# Altium footprint library Capacitors.PcbLib: 90 footprints (part 3 of 6)
Each footprint in its own frame and in the unit in brackets; x right, y up, seen from the top. Pads: shape width x height; smd on the part's side, far side on the other; paste and mask are expansions set on the pad; w line width, h text height; cw(c..) or ccw(c..) is an arc to the next point about the centre after c.
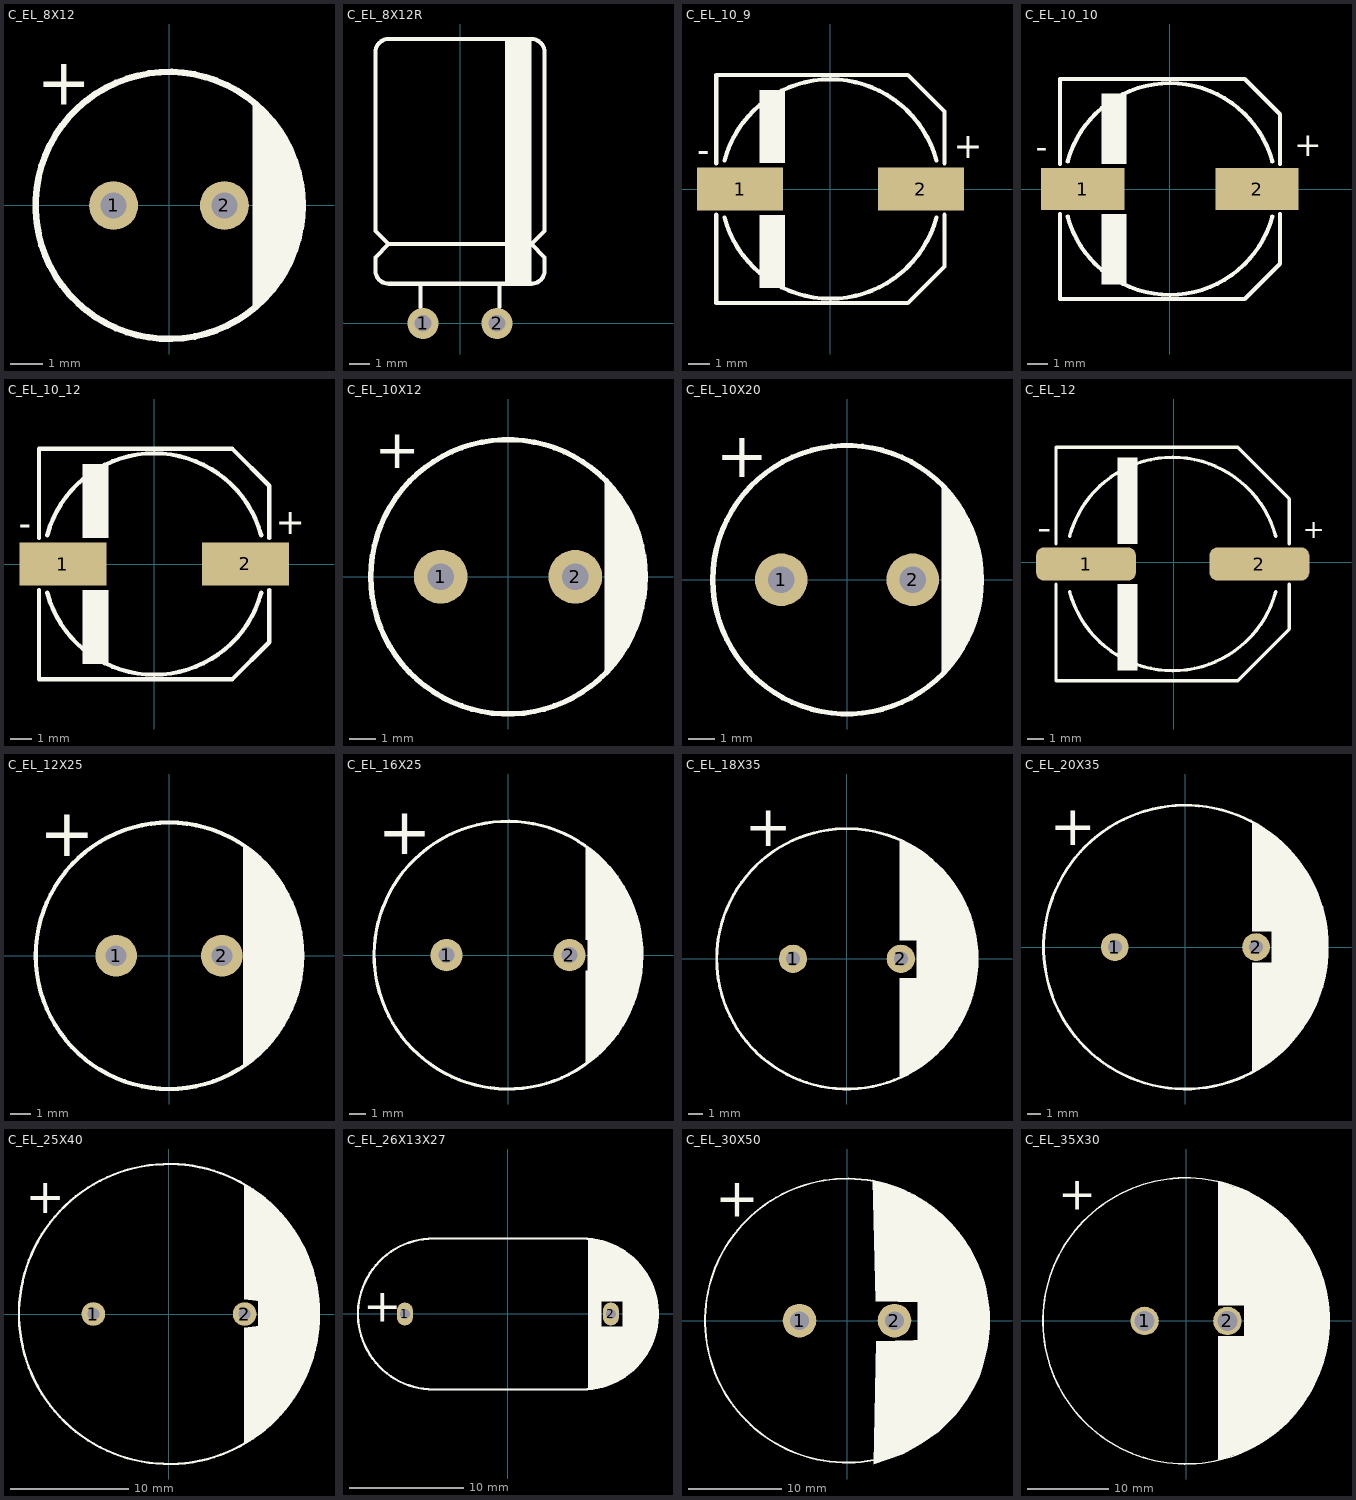
[diagram p2: the footprints below, top view; thin cyan lines are the x and y axes]

## C_EL_8X12 [mm] "Cap Elec, D8.0X12.0H pitch: 3.5mm, RB.14/.26, RB.15/.32"
height 12
pads (2):
  round 1.5 hole 0.8: 1(-1.7,0) 2(1.7,0)
Top Overlay:
  circle w0.2: c0,0 r4.1
  rectangle: 2.565,2.878 2.692,3.132
  rectangle: 2.565,-3.132 2.692,-2.878
  rectangle: 3.31,-2 3.691,1.962
  rectangle: 3.2,-2.286 3.505,2.291
  rectangle: 2.87,-2.534 3.302,2.575
  rectangle: 2.87,-2.718 3.124,2.769
  rectangle: 2.565,-2.972 2.946,2.975
  rectangle: 3.2,-1.575 3.886,1.575
  rectangle: 3.785,-1.067 4.013,0.991
  text "+" at -4.064,2.611 h2.5
3D body "User Library-Cap electro 8x11_5x3_5mm.step": height 2.98, standoff -12.53, extent -4.025,-4.025 4.025,4.025

## C_EL_8X12R [mm] "Cap Elec, D8.0X12.0H pitch: 3.5mm, RIGHT ANGLE"
pads (2):
  round 1.5 hole 0.8: 1(-1.778,0) 2(1.778,0)
Top Overlay:
  region: 2.159,13.67 2.159,1.905 3.429,1.905 3.429,13.67
  lines w0.2: -1.905,0.762 -1.905,1.905 ; 1.905,0.787 1.905,1.905 ; -3.429,3.81 -4.064,4.445 -4.064,13.035 cw(c-3.429,13.035) -3.429,13.67 3.429,13.67 cw(c3.429,13.035) 4.064,13.035 4.064,4.445 3.429,3.81 ; -3.429,3.81 -4.064,3.175 -4.064,2.54 ccw(c-3.429,2.54) -3.429,1.905 3.429,1.905 ccw(c3.429,2.54) 4.064,2.54 4.064,3.175 3.429,3.81 ; -3.429,3.81 3.429,3.81
3D body "User Library-Cap electro 8x11_5x3_5mm RA.step": height 8.03, standoff -2, extent -4.025,-0.3 4.025,13.521

## C_EL_10_9 [mm] "Electrolytic Cap, 10.3mm, L: 8.7mm"
height 8.7
pads (2):
  rect 4x2 smd: 1(-4.2,0) 2(4.2,0)
Top Overlay:
  region: -2.1,4.6 -3.3,4.6 -3.3,1.2 -2.1,1.2
  region: -2.1,-1.2 -3.3,-1.2 -3.3,-4.6 -2.1,-4.6
  lines w0.2: -5.3,-1.2 -5.3,-5.3 3.6,-5.3 5.3,-3.6 5.3,-1.2 ; -5.3,1.2 -5.3,5.3 3.6,5.3 5.3,3.6 5.3,1.2 ; -4.926,-1.32 ccw(c0,0) 4.926,-1.32 ; -4.926,1.32 cw(c0,0) 4.926,1.32
  text "+" at 5.74,1.038 h2
  text "-" at -6.198,0.86 h2
3D body "10x8.7x4.5.stp": height 8.55, standoff -0.15, extent -5.5,-5.15 5.5,5.15

## C_EL_10_10 [mm] "Electrolytic Cap, 10.3mm, L: 10mm"
height 10
pads (2):
  rect 4x2 smd: 1(-4.2,0) 2(4.2,0)
Top Overlay:
  region: -2.1,4.6 -3.3,4.6 -3.3,1.2 -2.1,1.2
  region: -2.1,-1.2 -3.3,-1.2 -3.3,-4.6 -2.1,-4.6
  lines w0.2: -5.3,-1.2 -5.3,-5.3 3.6,-5.3 5.3,-3.6 5.3,-1.2 ; -5.3,1.2 -5.3,5.3 3.6,5.3 5.3,3.6 5.3,1.2 ; -4.926,-1.32 ccw(c0,0) 4.926,-1.32 ; -4.926,1.32 cw(c0,0) 4.926,1.32
  text "-" at -6.452,1.089 h2
  text "+" at 5.994,1.19 h2
3D body "User Library-cap_10x10x10-1.STEP": height 10.5, standoff 0, extent -5.899,-5.25 5.901,5.25

## C_EL_10_12 [mm] "Electrolytic Cap, 10.3mm, L: 12.4mm"
height 12.4
pads (2):
  rect 4x2 smd: 1(-4.2,0) 2(4.2,0)
Top Overlay:
  region: -2.1,4.6 -3.3,4.6 -3.3,1.2 -2.1,1.2
  region: -2.1,-1.2 -3.3,-1.2 -3.3,-4.6 -2.1,-4.6
  lines w0.2: -5.3,-1.2 -5.3,-5.3 3.6,-5.3 5.3,-3.6 5.3,-1.2 ; -5.3,1.2 -5.3,5.3 3.6,5.3 5.3,3.6 5.3,1.2 ; -4.926,-1.32 ccw(c0,0) 4.926,-1.32 ; -4.926,1.32 cw(c0,0) 4.926,1.32
  text "+" at 5.588,0.987 h2
  text "-" at -6.223,0.937 h2
3D body "10x12.4x4.5.stp": height 12.45, standoff 0.05, extent -5.5,-5.15 5.5,5.15

## C_EL_10X12 [mm] "Cap Elec, D10.0X12.0H pitch: 5.0mm"
height 12
pads (2):
  round 2 hole 1: 1(-2.5,0) 2(2.5,0)
Top Overlay:
  circle w0.2: c0,0 r5.1
  rectangle: 3.581,-1.612 4.901,-0.952
  rectangle: 3.581,-1.194 5.055,1.016
  rectangle: 3.581,-3.531 3.785,-1.372
  rectangle: 3.581,-2.032 4.75,-1.473
  rectangle: 3.708,-2.438 4.572,-1.905
  rectangle: 3.709,-2.676 4.421,-1.94
  rectangle: 3.658,-3.302 4.013,-2.527
  rectangle: 3.878,-3.015 4.229,-2.462
  rectangle: 3.581,0.952 4.901,1.612
  rectangle: 3.581,-1.016 5.055,1.194
  rectangle: 3.581,1.372 3.785,3.531
  rectangle: 3.581,1.473 4.75,2.032
  rectangle: 3.708,1.905 4.572,2.438
  rectangle: 3.709,1.94 4.421,2.676
  rectangle: 3.658,2.527 4.013,3.302
  rectangle: 3.878,2.462 4.229,3.015
  text "+" at -4.953,3.551 h2.5
3D body "ELE Radial 10x12.STEP": height 13.7, standoff -1.7, extent -5.105,-5.099 5.05,5.061

## C_EL_10X20 [mm] "Cap Elec, D10.0X20.0H pitch: 5.0mm, RB.2/.4"
height 20
pads (2):
  round 2 hole 1: 1(-2.5,0) 2(2.5,0)
Top Overlay:
  circle w0.2: c0,0 r5.1
  rectangle: 3.6,-1 5.1,1
  rectangle: 3.581,0.952 4.901,1.612
  rectangle: 3.581,-1.016 5.055,1.194
  rectangle: 3.581,1.372 3.785,3.531
  rectangle: 3.581,1.473 4.75,2.032
  rectangle: 3.708,1.905 4.572,2.438
  rectangle: 3.709,1.94 4.421,2.676
  rectangle: 3.658,2.527 4.013,3.302
  rectangle: 3.878,2.462 4.229,3.015
  rectangle: 3.581,-1.612 4.901,-0.952
  rectangle: 3.581,-1.194 5.055,1.016
  rectangle: 3.581,-3.531 3.785,-1.372
  rectangle: 3.581,-2.032 4.75,-1.473
  rectangle: 3.708,-2.438 4.572,-1.905
  rectangle: 3.709,-2.676 4.421,-1.94
  rectangle: 3.658,-3.302 4.013,-2.527
  rectangle: 3.878,-3.015 4.229,-2.462
  text "+" at -4.978,3.296 h3
3D body "CE_R200_D400_H800.step": height 20.62, standoff -2.6, extent -5.08,-5.101 5.08,5.038

## C_EL_12 [mm] "Electrolytic Cap, 12.5x13mm"
height 10
pads (2):
  rrect50% 6x2 smd mask+0.1: 1(-5.251,-0.102) 2(5.149,-0.102)
Top Overlay:
  region: -2.151,6.298 -3.351,6.298 -3.351,1.098 -2.151,1.098
  region: -2.151,-1.302 -3.351,-1.302 -3.351,-6.502 -2.151,-6.502
  lines w0.2: -7.051,-1.302 -7.051,-7.102 3.849,-7.102 6.949,-4.002 6.949,-1.302 ; -7.051,1.098 -7.051,6.898 3.849,6.898 6.949,3.798 6.949,1.098 ; -6.233,-1.758 ccw(c-0.051,-0.102) 6.131,-1.758 ; -6.233,1.555 cw(c-0.051,-0.102) 6.131,1.555
  text "-" at -8.179,0.693 h3
  text "+" at 7.747,1.063 h2
3D body "User Library-ALU-H16.step": height 17, standoff 0, extent -7.801,-6.951 7.699,6.749

## C_EL_12X25 [mm] "Cap Elec, D12.0X25.0H pitch: 5.0mm, RB.2/.5"
pads (2):
  round 2 hole 1: 1(-2.54,0) 2(2.54,0)
Top Overlay:
  circle w0.2: c0,0 r6.4
  rectangle: 4.11,-4.619 4.408,-4.492
  rectangle: 4.668,-4.115 4.925,-3.88
  rectangle: 4.439,-4.393 4.801,-3.937
  rectangle: 4.14,-4.572 4.521,-3.81
  rectangle: 3.694,-5.083 4.052,-4.774
  rectangle: 3.645,-4.844 4.327,-4.246
  rectangle: 3.683,-4.623 4.318,-3.81
  rectangle: 3.619,-4.064 5.029,-3.785
  rectangle: 3.668,-2.438 5.994,-1.905
  rectangle: 3.669,-2.676 5.817,-1.94
  rectangle: 3.838,-3.015 5.732,-2.462
  rectangle: 3.618,-3.302 5.571,-2.527
  rectangle: 3.541,-5.232 3.785,-3.251
  rectangle: 3.678,-3.729 5.297,-3.465
  rectangle: 3.619,-3.868 5.233,-3.67
  rectangle: 3.619,3.67 5.233,3.868
  rectangle: 3.678,3.465 5.297,3.729
  rectangle: 3.541,3.251 3.785,5.232
  rectangle: 3.618,-3.302 5.571,-2.527
  rectangle: 3.838,-3.015 5.732,-2.462
  rectangle: 3.669,-2.676 5.817,-1.94
  rectangle: 3.668,-2.438 5.994,-1.905
  rectangle: 3.541,-2.032 6.121,-1.473
  rectangle: 3.541,-3.531 5.403,-1.372
  rectangle: 3.541,-1.194 5.015,1.016
  rectangle: 3.541,-1.612 6.274,-0.952
  rectangle: 3.541,-1.016 6.4,1.194
  rectangle: 3.618,2.527 5.571,3.302
  rectangle: 3.838,2.462 5.732,3.015
  rectangle: 3.669,1.94 5.817,2.676
  rectangle: 3.668,1.905 5.994,2.438
  rectangle: 3.541,1.473 6.121,2.032
  rectangle: 3.541,1.372 5.403,3.531
  rectangle: 3.541,-1.016 5.015,1.194
  rectangle: 3.541,0.952 6.274,1.612
  rectangle: 3.541,-1.194 6.4,1.016
  rectangle: 3.619,3.785 5.029,4.064
  rectangle: 3.683,3.81 4.318,4.623
  rectangle: 3.645,4.246 4.327,4.844
  rectangle: 3.694,4.774 4.052,5.083
  rectangle: 4.14,3.81 4.521,4.572
  rectangle: 4.439,3.937 4.801,4.393
  rectangle: 4.668,3.88 4.925,4.115
  rectangle: 4.11,4.492 4.408,4.619
  text "+" at -6.223,4.006 h4
3D body "User Library-Cap-EL(12_5x25-5)T.step": height 25.8, standoff -3.2, extent -6.25,-6.281 6.252,6.219

## C_EL_16X25 [mm] "Cap Elec, D16.0X25.0H pitch: 7.6mm, RB.3/.6"
pads (2):
  round 2 hole 1: 1(-3.81,0) 2(3.81,0)
Top Overlay:
  rectangle: 7.46,2.133 7.886,2.914
  rectangle: 7.391,1.397 8.077,2.311
  rectangle: 4.938,1.905 7.264,4.173
  rectangle: 5.07,-0.7 8.25,1.441
  rectangle: 5.38,-4.619 5.678,-4.492
  rectangle: 5.938,-4.115 6.195,-3.88
  rectangle: 5.709,-4.393 6.071,-3.937
  rectangle: 5.41,-4.572 5.791,-3.81
  rectangle: 4.964,-5.083 5.322,-4.774
  rectangle: 4.915,-4.844 5.597,-4.246
  rectangle: 4.953,-4.623 5.588,-3.81
  rectangle: 4.889,-4.064 6.299,-3.785
  rectangle: 4.938,-2.438 7.264,-1.905
  rectangle: 4.939,-2.676 7.087,-1.94
  rectangle: 5.108,-3.015 7.002,-2.462
  rectangle: 4.888,-3.302 6.841,-2.527
  rectangle: 4.811,-5.232 5.055,-3.251
  rectangle: 4.948,-3.729 6.567,-3.465
  rectangle: 4.889,-3.868 6.503,-3.67
  rectangle: 4.889,3.67 6.503,5.309
  rectangle: 4.948,3.465 6.567,5.029
  rectangle: 4.811,3.251 5.055,6.655
  rectangle: 4.888,-3.302 6.841,-2.527
  rectangle: 5.108,-3.015 7.002,-2.462
  rectangle: 4.939,-2.676 7.087,-1.94
  rectangle: 4.938,-2.438 7.264,-1.905
  rectangle: 4.811,-2.032 7.391,-1.473
  rectangle: 4.811,-3.531 6.673,-1.372
  rectangle: 4.979,-1.194 6.285,1.016
  rectangle: 4.811,-1.612 7.544,-0.952
  rectangle: 5.09,-1.016 7.67,3.305
  rectangle: 4.888,2.527 6.841,4.949
  rectangle: 5.108,2.462 7.002,4.597
  rectangle: 4.939,1.94 7.087,4.317
  rectangle: 4.811,1.473 7.391,3.835
  rectangle: 4.811,1.372 6.673,3.531
  rectangle: 4.953,-1.016 6.285,1.194
  rectangle: 4.811,0.952 7.544,3.617
  rectangle: 4.979,-1.194 7.67,1.016
  rectangle: 4.889,3.785 6.299,5.401
  rectangle: 4.953,3.81 5.588,4.623
  rectangle: 4.915,4.246 5.597,6.275
  rectangle: 4.964,4.774 5.322,6.502
  rectangle: 5.41,3.81 5.791,5.994
  rectangle: 5.709,3.937 6.071,5.819
  rectangle: 5.938,3.88 6.195,5.63
  rectangle: 5.38,4.492 5.678,5.994
  rectangle: 7.46,-2.914 7.886,-2.133
  rectangle: 7.391,-2.311 8.077,-1.397
  rectangle: 4.938,-4.173 7.264,-1.905
  rectangle: 5.07,-1.441 8.25,0.7
  rectangle: 4.889,-5.309 6.503,-3.67
  rectangle: 4.948,-5.029 6.567,-3.465
  rectangle: 4.811,-6.655 5.055,-3.251
  rectangle: 5.129,-3.305 7.67,1.016
  rectangle: 4.888,-4.949 6.841,-2.527
  rectangle: 5.108,-4.597 7.002,-2.462
  rectangle: 4.939,-4.317 7.087,-1.94
  rectangle: 4.811,-3.835 7.391,-1.473
  rectangle: 4.811,-3.531 6.673,-1.372
  rectangle: 4.918,-1.194 6.285,1.016
  rectangle: 4.811,-3.617 7.544,-0.952
  rectangle: 4.889,-5.401 6.299,-3.785
  rectangle: 4.953,-4.623 5.588,-3.81
  rectangle: 4.915,-6.275 5.597,-4.246
  rectangle: 4.964,-6.502 5.322,-4.774
  rectangle: 5.41,-5.994 5.791,-3.81
  rectangle: 5.709,-5.819 6.071,-3.937
  rectangle: 5.938,-5.63 6.195,-3.88
  rectangle: 5.38,-5.994 5.678,-4.492
  lines w0.2: 8.148,-1.584 cw(c0,0) 8.152,-1.563
  text "+" at -8.077,5.299 h5
3D body "User Library-CE_R300_D650_H1000.step": height 25.4, standoff -3.5, extent -8.402,-7.785 8.098,8.7

## C_EL_18X35 [mm] "Cap Elec, D18.0X35.0H pitch: 7.6mm, RB.3/.7"
pads (2):
  round 2 hole 1: 1(-3.81,0) 2(3.81,0)
Top Overlay:
  circle w0.2: c0,0 r9.2
  rectangle: 8.382,-1.626 9.119,-0.356
  rectangle: 8.026,-0.635 9.119,1.321
  rectangle: 8.484,0.152 9.017,1.88
  rectangle: 8.484,-2.134 8.915,2.261
  rectangle: 7.391,-3.683 8.484,-3.15
  rectangle: 7.493,-3.378 8.585,-2.819
  rectangle: 7.391,-3.937 8.331,-3.15
  rectangle: 7.671,-3.15 8.712,-2.565
  rectangle: 8.052,-2.743 8.814,-1.88
  rectangle: 7.849,-4.216 8.23,-2.184
  rectangle: 8.001,-2.337 8.839,2.896
  rectangle: 3.732,-8.309 4.163,-7.87
  rectangle: 3.752,-8.127 4.438,-7.949
  rectangle: 4.117,-7.906 4.902,-7.468
  rectangle: 3.734,-7.976 4.521,-7.442
  region: 3.711,-8.357 3.761,-8.356 3.756,-7.341 3.707,-7.341
  rectangle: 3.937,-7.493 5.486,-6.833
  rectangle: 3.708,-7.698 5.182,-1.348
  region: 6.966,-5.663 7.391,-5.588 7.347,-5.338 6.922,-5.413
  rectangle: 6.502,-6.126 6.985,6.147
  rectangle: 5.994,-6.413 6.731,6.401
  rectangle: 6.121,-6.604 6.477,6.655
  rectangle: 5.867,-6.856 6.274,6.858
  rectangle: 4.928,-7.112 5.994,7.112
  rectangle: 3.708,1.299 5.182,7.698
  rectangle: 3.707,7.479 4.342,8.179
  rectangle: 3.707,7.95 4.039,8.329
  rectangle: 4.088,7.53 4.953,7.826
  rectangle: 4.242,7.772 4.663,8.011
  rectangle: 4.47,1.448 5.41,7.53
  rectangle: 5.156,-7.315 5.69,7.366
  rectangle: 6.172,-4.547 8.077,4.191
  rectangle: 6.096,3.759 7.163,5.842
  rectangle: 6.731,3.048 7.341,5.639
  rectangle: 7.112,2.896 7.544,5.41
  rectangle: 7.391,3.327 7.696,5.182
  rectangle: 7.62,3.734 7.849,4.851
  rectangle: 7.544,2.896 8.001,4.623
  rectangle: 7.366,3.835 7.849,4.851
  rectangle: 7.671,3.124 8.001,4.623
  rectangle: 7.62,3.734 8.077,4.42
  rectangle: 6.756,-5.842 7.239,-4.42
  rectangle: 7.061,-4.826 7.893,-4.496
  region: 7.747,-5.131 7.747,-4.674 7.163,-4.674 7.163,-5.131
  region: 7.544,-5.41 7.544,-4.877 7.163,-4.877 7.163,-5.41
  region: 8.903,-2.235 9.121,-1.638 8.882,-1.551 8.665,-2.148
  rectangle: 7.62,2.769 8.458,3.734
  rectangle: 7.823,3.609 8.28,4.216
  rectangle: 7.417,2.846 8.355,4.089
  rectangle: 8.43,2.603 8.613,3.384
  rectangle: 8.135,2.367 8.689,3.007
  text "+" at -7.214,7.001 h5
3D body "User Library-cap-3.step": height 35.05, standoff -3.6, extent -10.222,-10.558 10.679,10.301

## C_EL_20X35 [mm] "Cap Elec, D20.0X35.0H pitch: 10.0mm, RB.4/.8"
pads (2):
  round 2 hole 1: 1(-5.08,0) 2(5.08,0)
Top Overlay:
  circle w0.2: c0,0 r10.2
  rectangle: 9.449,-1.6 10.185,-0.33
  rectangle: 9.093,-0.61 10.185,1.346
  rectangle: 9.55,0.178 10.084,1.905
  rectangle: 9.55,-2.108 9.982,2.286
  rectangle: 8.458,-3.658 9.55,-3.124
  rectangle: 8.56,-3.353 9.652,-2.794
  rectangle: 8.458,-3.912 9.398,-3.124
  rectangle: 8.738,-3.124 9.779,-2.54
  rectangle: 9.119,-2.718 9.881,-1.854
  rectangle: 8.915,-4.191 9.296,-2.159
  rectangle: 9.068,-2.311 9.906,2.921
  rectangle: 4.799,-8.283 5.23,-7.845
  rectangle: 4.819,-8.101 5.504,-7.924
  rectangle: 5.184,-7.88 5.969,-7.442
  rectangle: 4.801,-7.95 5.588,-7.417
  region: 4.778,-8.331 4.827,-8.331 4.823,-7.315 4.774,-7.315
  rectangle: 5.004,-7.468 6.553,-6.807
  rectangle: 4.775,-7.672 6.248,-1.118
  region: 8.033,-5.638 8.458,-5.563 8.414,-5.312 7.989,-5.387
  rectangle: 7.569,-6.101 8.052,6.422
  rectangle: 7.061,-6.388 7.798,6.736
  rectangle: 7.188,-6.579 7.544,6.962
  rectangle: 6.934,-6.83 7.341,7.251
  rectangle: 6.179,-7.087 7.061,7.517
  rectangle: 4.775,1.168 6.248,8.141
  rectangle: 4.774,7.505 5.409,8.73
  rectangle: 4.774,7.976 5.105,8.915
  rectangle: 5.155,7.556 6.02,8.325
  rectangle: 5.309,7.798 5.729,8.539
  rectangle: 5.537,1.473 6.477,7.942
  rectangle: 6.223,-7.29 6.756,7.765
  rectangle: 7.239,-4.521 9.144,4.216
  rectangle: 7.163,3.785 8.23,6.148
  rectangle: 7.798,3.073 8.407,5.901
  rectangle: 8.179,2.921 8.611,5.605
  rectangle: 8.458,3.353 8.763,5.331
  rectangle: 8.687,3.759 8.915,5.057
  rectangle: 8.611,2.921 9.068,4.648
  rectangle: 8.433,3.861 8.915,4.877
  rectangle: 8.738,3.15 9.068,4.788
  rectangle: 8.687,3.759 9.144,4.445
  rectangle: 7.823,-5.817 8.306,-4.394
  rectangle: 8.128,-4.801 8.959,-4.47
  region: 8.814,-5.105 8.814,-4.648 8.23,-4.648 8.23,-5.105
  region: 8.611,-5.385 8.611,-4.851 8.23,-4.851 8.23,-5.385
  region: 9.97,-2.209 10.187,-1.613 9.949,-1.526 9.731,-2.123
  rectangle: 8.687,2.794 9.525,3.759
  rectangle: 8.785,3.859 9.242,4.466
  rectangle: 8.484,2.871 9.422,4.115
  rectangle: 9.497,2.629 9.68,3.409
  rectangle: 9.201,2.392 9.755,3.032
  rectangle: 6.34,-0.7 10.2,0.7
  rectangle: 9.449,0.33 10.185,1.6
  rectangle: 9.093,-1.346 10.185,0.61
  rectangle: 9.55,-1.905 10.084,-0.178
  rectangle: 9.55,-2.286 9.982,2.108
  rectangle: 8.458,3.124 9.55,3.658
  rectangle: 8.56,2.794 9.652,3.353
  rectangle: 8.458,3.124 9.398,3.912
  rectangle: 8.738,2.54 9.779,3.124
  rectangle: 9.119,1.854 9.881,2.718
  rectangle: 8.915,2.159 9.296,4.191
  rectangle: 9.068,-2.921 9.906,2.311
  rectangle: 4.799,7.845 5.23,8.283
  rectangle: 4.819,7.924 5.504,8.101
  rectangle: 5.184,7.442 5.969,7.88
  rectangle: 4.801,7.417 5.588,7.95
  region: 4.774,7.315 4.823,7.315 4.827,8.331 4.778,8.331
  rectangle: 5.004,6.807 6.553,7.468
  rectangle: 4.775,1.118 6.248,7.672
  region: 7.989,5.387 8.414,5.312 8.458,5.563 8.033,5.638
  rectangle: 7.569,-6.422 8.052,6.101
  rectangle: 7.061,-6.736 7.798,6.388
  rectangle: 7.188,-6.962 7.544,6.579
  rectangle: 6.934,-7.251 7.341,6.83
  rectangle: 6.179,-7.517 7.061,7.087
  rectangle: 4.775,-8.141 6.248,-1.168
  rectangle: 4.774,-8.73 5.409,-7.505
  rectangle: 4.774,-8.915 5.105,-7.976
  rectangle: 5.155,-8.325 6.02,-7.556
  rectangle: 5.309,-8.539 5.729,-7.798
  rectangle: 5.537,-7.942 6.477,-1.473
  rectangle: 6.223,-7.765 6.756,7.29
  rectangle: 7.239,-4.216 9.144,4.521
  rectangle: 7.163,-6.148 8.23,-3.785
  rectangle: 7.798,-5.901 8.407,-3.073
  rectangle: 8.179,-5.605 8.611,-2.921
  rectangle: 8.458,-5.331 8.763,-3.353
  rectangle: 8.687,-5.057 8.915,-3.759
  rectangle: 8.611,-4.648 9.068,-2.921
  rectangle: 8.433,-4.877 8.915,-3.861
  rectangle: 8.738,-4.788 9.068,-3.15
  rectangle: 8.687,-4.445 9.144,-3.759
  rectangle: 7.823,4.394 8.306,5.817
  rectangle: 8.128,4.47 8.959,4.801
  region: 8.23,5.105 8.23,4.648 8.814,4.648 8.814,5.105
  region: 8.23,5.385 8.23,4.851 8.611,4.851 8.611,5.385
  region: 9.731,2.123 9.949,1.526 10.187,1.613 9.97,2.209
  rectangle: 8.687,-3.759 9.525,-2.794
  rectangle: 8.785,-4.466 9.242,-3.859
  rectangle: 8.484,-4.115 9.422,-2.871
  rectangle: 9.497,-3.409 9.68,-2.629
  rectangle: 9.201,-3.032 9.755,-2.392
  rectangle: 6.34,-0.7 10.2,0.7
  text "+" at -9.754,6.366 h5
3D body "User Library-Cap electrolitic radial 20x35.STEP": height 35.8, standoff -0.7, extent -10.146,-9.86 9.844,10.129

## C_EL_25X40 [mm] "Cap Elec, D25.0X40.0H pitch: 12.8mm, RB.5/1"
pads (2):
  round 2 hole 1: 1(-6.4,0) 2(6.4,0)
Top Overlay:
  drawing of 5 lines, arcs and shapes, not listed
  text "+" at -12.116,7.56 h5
3D body "User Library-CE_R530_D1000_H1750.step": height 42.2, standoff -2.5, extent -12.704,-12.725 12.675,12.675

## C_EL_26X13X27 [mm] "Cap Elec, 26X13X27mm, 18mm pitch"
height 27
pads (2):
  oval 1.4x2 hole 0.9: 1(-9,0) 2(9,0)
Top Overlay:
  rectangle: 9.995,-1.372 13.008,1.478
  rectangle: 12.724,-0.371 13.115,0.627
  rectangle: 7.01,-1.905 8.179,1.778
  region: 7.01,-6.528 7.01,-1.118 12.979,-1.118 12.974,-1.118 12.965,-1.122 12.958,-1.129 12.954,-1.138 12.954,-1.143 12.954,-1.601 12.649,-2.439 11.938,-3.709 11.227,-4.623 9.56,-5.941 7.137,-6.612
  region: 7.01,6.528 7.01,1.118 12.979,1.118 12.974,1.118 12.965,1.122 12.958,1.129 12.954,1.138 12.954,1.143 12.954,1.6 12.649,2.438 11.938,3.708 11.227,4.623 9.56,5.94 7.137,6.612
  lines w0.2: -6.5,-6.6 cw(c-6.5,0) -6.5,6.6 6.5,6.6 cw(c6.5,0) 6.5,-6.6 -6.5,-6.6
  text "+" at -12.624,-1.635 h5
3D body: height 3, standoff -2, extent 8.7,-0.299 9.298,0.3
3D body: height 27, standoff 0, extent -13,-6.5 0,6.5
3D body: height 27, standoff 0, extent 0,-6.5 13,6.5
3D body: height 27, standoff 0, extent -7,-6.5 7,6.5
3D body: height 3, standoff -2, extent -9.297,-0.299 -8.7,0.299

## C_EL_30X50 [mm] "Cap Elec, D30.0X50.0H pitch: 10.0mm"
pads (2):
  round 3.6 hole 2: 1(-5.08,0) 2(5.08,0)
Top Overlay:
  circle w0.2: c0,0 r15.2
  rectangle: 13.792,-0.152 15.138,1.524
  rectangle: 14.122,0.914 15.001,2.297
  rectangle: 11.252,1.245 14.199,3.759
  rectangle: 12.268,-2.667 15.041,1.927
  rectangle: 7.569,-4.724 12.776,4.191
  rectangle: 14.783,-1.422 15.164,0.254
  region: 2.839,-15.352 3.134,-2.207 15.149,-1.904 15.037,-2.946 14.554,-4.877 14.199,-5.893 13.665,-7.01 12.827,-8.458 11.684,-10.033 9.83,-11.887 7.976,-13.208 5.994,-14.3
  region: 2.763,15.073 3.054,2.082 15.057,1.78 14.961,2.667 14.478,4.597 14.122,5.613 13.589,6.731 12.751,8.179 11.608,9.754 9.754,11.608 7.899,12.929 5.918,14.021
  text "+" at -14.122,9.766 h7
3D body "User Library-Assy_CE_R400_D1200_H2000.STEP": height 50.8, standoff -6.89, extent -15.24,-15.192 15.24,15.272

## C_EL_35X30 [mm] "Cap Elec, D35.0X30.0H pitch: 10.0mm, 470uF/400V, RB.44/1.3"
height 33
pads (2):
  round 3.5 hole 2.5: 1(-5.1,0) 2(5.1,0)
Top Overlay:
  circle w0.2: c0,0 r17.6
  rectangle: 7.163,-3.353 16.866,4.039
  rectangle: 16.764,-2.235 17.375,2.311
  rectangle: 9.627,-2.616 17.514,1.997
  region: 3.988,17.12 3.988,1.905 17.501,1.905 17.348,2.718 17.196,3.785 16.789,5.131 16.561,5.918 15.773,7.696 15.57,8.103 14.757,9.627 13.716,11.074 12.471,12.344 11.582,13.208 10.389,14.224 8.433,15.418 6.909,16.154
  region: 3.988,-17.12 3.988,-1.905 17.501,-1.905 17.348,-2.718 17.196,-3.785 16.789,-5.131 16.561,-5.918 15.773,-7.696 15.57,-8.103 14.757,-9.627 13.716,-11.074 12.471,-12.344 11.582,-13.208 10.389,-14.224 8.433,-15.418 6.909,-16.154
  text "+" at -15.723,12.306 h7
3D body "User Library-el_cap_470uF-400V.step": height 46.5, standoff -3.7, extent -17.5,-17.5 17.5,17.5